# Altium footprint library con-samtec.PCBLIB: 805 footprints (part 32 of 55)
Each footprint in its own frame and in the unit in brackets; x right, y up, seen from the top. Pads: shape width x height; smd on the part's side, far side on the other; paste and mask are expansions set on the pad; w line width, h text height; cw(c..) or ccw(c..) is an arc to the next point about the centre after c.
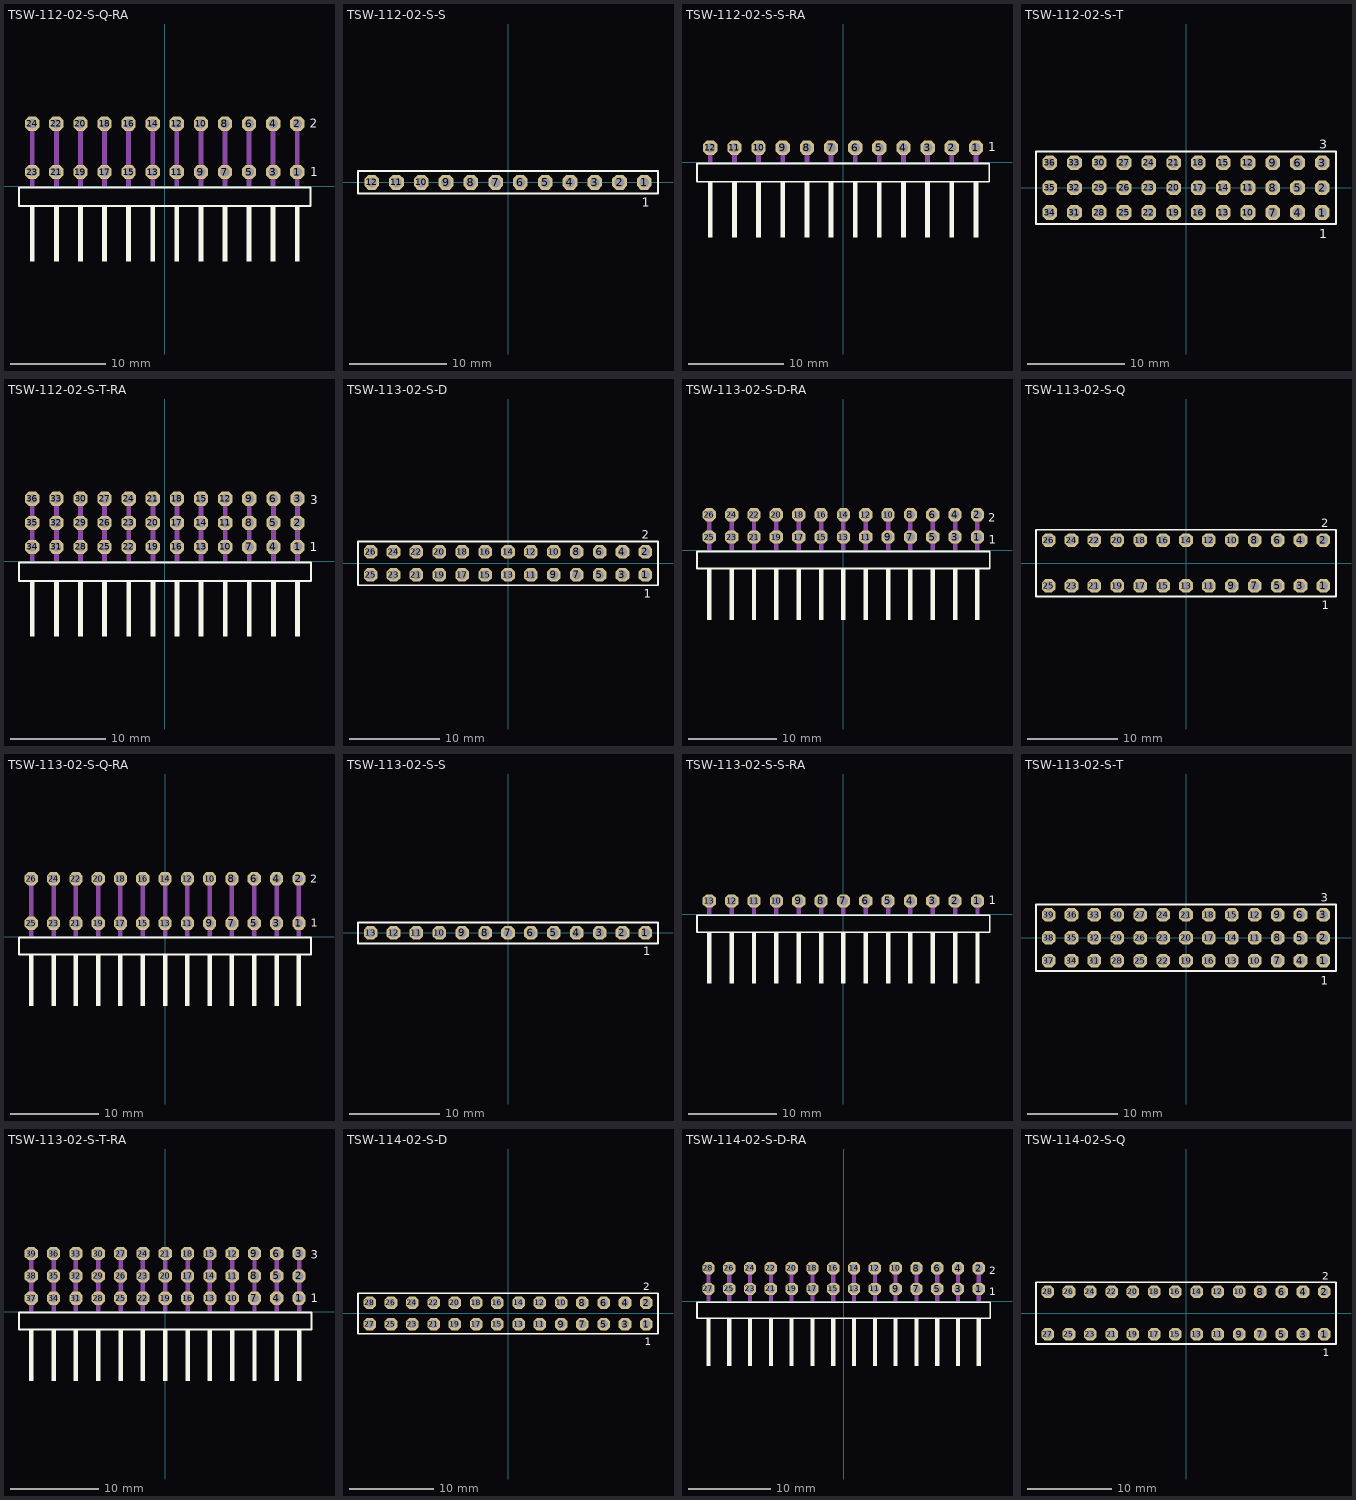
[diagram p31: the footprints below, top view; thin cyan lines are the x and y axes]

## TSW-112-02-S-Q-RA [mil]
pads (24):
  oct 59.06x59.06 hole 39.37: 1(550,60) 2(550,260) 3(450,60) 4(450,260) 5(350,60) 6(350,260) 7(250,60) 8(250,260) 9(150,60) 10(150,260) 11(50,60) 12(50,260) 13(-50,60) 14(-50,260) 15(-150,60) 16(-150,260) 17(-250,60) 18(-250,260) 19(-350,60) 20(-350,260) 21(-450,60) 22(-450,260) 23(-550,60) 24(-550,260)
Top Overlay:
  rectangle: -560,-310.63 -540,-80.32
  rectangle: -460,-310.63 -440,-80.32
  rectangle: -360,-310.63 -340,-80.32
  rectangle: -260,-310.63 -240,-80.32
  rectangle: -160,-310.63 -140,-80.32
  rectangle: -60,-310.63 -40,-80.32
  rectangle: 40,-310.63 60,-80.32
  rectangle: 140,-310.63 160,-80.32
  rectangle: 240,-310.63 260,-80.32
  rectangle: 340,-310.63 360,-80.32
  rectangle: 440,-310.63 460,-80.32
  rectangle: 540,-310.63 560,-80.32
  lines w8: -605.08,-80.55 605.08,-80.55 605.08,-4.17 -605.08,-4.17 -605.08,-80.55
  text "1" at 603.54,43.31 h36.81
  text "2" at 601.18,242.72 h36.81
Mechanical 16:
  rectangle: -560,0 -540,270
  rectangle: -460,0 -440,270
  rectangle: -360,0 -340,270
  rectangle: -260,0 -240,270
  rectangle: -160,0 -140,270
  rectangle: -60,0 -40,270
  rectangle: 40,0 60,270
  rectangle: 140,0 160,270
  rectangle: 240,0 260,270
  rectangle: 340,0 360,270
  rectangle: 440,0 460,270
  rectangle: 540,0 560,270

## TSW-112-02-S-S [mm]
pads (12):
  oct 1.5x1.5 hole 1: 1(13.97,0) 2(11.43,0) 3(8.89,0) 4(6.35,0) 5(3.81,0) 6(1.27,0) 7(-1.27,0) 8(-3.81,0) 9(-6.35,0) 10(-8.89,0) 11(-11.43,0) 12(-13.97,0)
Top Overlay:
  lines w0.203: -15.369,-1.155 15.369,-1.155 15.369,1.155 -15.369,1.155 -15.369,-1.155
  text "1" at 13.712,-2.498 h0.94
Mechanical 16:
  rectangle: -14.32,-0.35 -13.62,0.35
  rectangle: -11.78,-0.35 -11.08,0.35
  rectangle: -9.24,-0.35 -8.54,0.35
  rectangle: -6.7,-0.35 -6,0.35
  rectangle: -4.16,-0.35 -3.46,0.35
  rectangle: -1.62,-0.35 -0.92,0.35
  rectangle: 0.92,-0.35 1.62,0.35
  rectangle: 3.46,-0.35 4.16,0.35
  rectangle: 6,-0.35 6.7,0.35
  rectangle: 8.54,-0.35 9.24,0.35
  rectangle: 11.08,-0.35 11.78,0.35
  rectangle: 13.62,-0.35 14.32,0.35

## TSW-112-02-S-S-RA [mil]
pads (12):
  oct 59.06x59.06 hole 39.37: 1(550,60) 2(450,60) 3(350,60) 4(250,60) 5(150,60) 6(50,60) 7(-50,60) 8(-150,60) 9(-250,60) 10(-350,60) 11(-450,60) 12(-550,60)
Top Overlay:
  rectangle: -560,-310.63 -540,-80.32
  rectangle: -460,-310.63 -440,-80.32
  rectangle: -360,-310.63 -340,-80.32
  rectangle: -260,-310.63 -240,-80.32
  rectangle: -160,-310.63 -140,-80.32
  rectangle: -60,-310.63 -40,-80.32
  rectangle: 40,-310.63 60,-80.32
  rectangle: 140,-310.63 160,-80.32
  rectangle: 240,-310.63 260,-80.32
  rectangle: 340,-310.63 360,-80.32
  rectangle: 440,-310.63 460,-80.32
  rectangle: 540,-310.63 560,-80.32
  lines w8: -605.08,-80.55 605.08,-80.55 605.08,-4.17 -605.08,-4.17 -605.08,-80.55
  text "1" at 600.47,45.35 h36.81
Mechanical 16:
  rectangle: -560,0 -540,70
  rectangle: -460,0 -440,70
  rectangle: -360,0 -340,70
  rectangle: -260,0 -240,70
  rectangle: -160,0 -140,70
  rectangle: -60,0 -40,70
  rectangle: 40,0 60,70
  rectangle: 140,0 160,70
  rectangle: 240,0 260,70
  rectangle: 340,0 360,70
  rectangle: 440,0 460,70
  rectangle: 540,0 560,70

## TSW-112-02-S-T [mm]
pads (36):
  oct 1.5x1.5 hole 1: 1(13.97,-2.54) 2(13.97,0) 3(13.97,2.54) 4(11.43,-2.54) 5(11.43,0) 6(11.43,2.54) 7(8.89,-2.54) 8(8.89,0) 9(8.89,2.54) 10(6.35,-2.54) 11(6.35,0) 12(6.35,2.54) 13(3.81,-2.54) 14(3.81,0) 15(3.81,2.54) 16(1.27,-2.54) 17(1.27,0) 18(1.27,2.54) 19(-1.27,-2.54) 20(-1.27,0) 21(-1.27,2.54) 22(-3.81,-2.54) 23(-3.81,0) 24(-3.81,2.54) 25(-6.35,-2.54) 26(-6.35,0) 27(-6.35,2.54) 28(-8.89,-2.54) 29(-8.89,0) 30(-8.89,2.54) 31(-11.43,-2.54) 32(-11.43,0) 33(-11.43,2.54) 34(-13.97,-2.54) 35(-13.97,0) 36(-13.97,2.54)
Top Overlay:
  lines w0.203: -15.369,-3.695 15.369,-3.695 15.369,3.695 -15.369,3.695 -15.369,-3.695
  text "1" at 13.662,-5.188 h0.94
  text "3" at 13.658,3.989 h0.94
Mechanical 16:
  rectangle: -14.32,-2.89 -13.62,-2.19
  rectangle: -14.32,-0.35 -13.62,0.35
  rectangle: -14.32,2.19 -13.62,2.89
  rectangle: -11.78,-2.89 -11.08,-2.19
  rectangle: -11.78,-0.35 -11.08,0.35
  rectangle: -11.78,2.19 -11.08,2.89
  rectangle: -9.24,-2.89 -8.54,-2.19
  rectangle: -9.24,-0.35 -8.54,0.35
  rectangle: -9.24,2.19 -8.54,2.89
  rectangle: -6.7,-2.89 -6,-2.19
  rectangle: -6.7,-0.35 -6,0.35
  rectangle: -6.7,2.19 -6,2.89
  rectangle: -4.16,-2.89 -3.46,-2.19
  rectangle: -4.16,-0.35 -3.46,0.35
  rectangle: -4.16,2.19 -3.46,2.89
  rectangle: -1.62,-2.89 -0.92,-2.19
  rectangle: -1.62,-0.35 -0.92,0.35
  rectangle: -1.62,2.19 -0.92,2.89
  rectangle: 0.92,-2.89 1.62,-2.19
  rectangle: 0.92,-0.35 1.62,0.35
  rectangle: 0.92,2.19 1.62,2.89
  rectangle: 3.46,-2.89 4.16,-2.19
  rectangle: 3.46,-0.35 4.16,0.35
  rectangle: 3.46,2.19 4.16,2.89
  rectangle: 6,-2.89 6.7,-2.19
  rectangle: 6,-0.35 6.7,0.35
  rectangle: 6,2.19 6.7,2.89
  rectangle: 8.54,-2.89 9.24,-2.19
  rectangle: 8.54,-0.35 9.24,0.35
  rectangle: 8.54,2.19 9.24,2.89
  rectangle: 11.08,-2.89 11.78,-2.19
  rectangle: 11.08,-0.35 11.78,0.35
  rectangle: 11.08,2.19 11.78,2.89
  rectangle: 13.62,-2.89 14.32,-2.19
  rectangle: 13.62,-0.35 14.32,0.35
  rectangle: 13.62,2.19 14.32,2.89

## TSW-112-02-S-T-RA [mil]
pads (36):
  oct 59.06x59.06 hole 39.37: 1(550,60) 2(550,160) 3(550,260) 4(450,60) 5(450,160) 6(450,260) 7(350,60) 8(350,160) 9(350,260) 10(250,60) 11(250,160) 12(250,260) 13(150,60) 14(150,160) 15(150,260) 16(50,60) 17(50,160) 18(50,260) 19(-50,60) 20(-50,160) 21(-50,260) 22(-150,60) 23(-150,160) 24(-150,260) 25(-250,60) 26(-250,160) 27(-250,260) 28(-350,60) 29(-350,160) 30(-350,260) 31(-450,60) 32(-450,160) 33(-450,260) 34(-550,60) 35(-550,160) 36(-550,260)
Top Overlay:
  rectangle: -560,-310.63 -540,-80.32
  rectangle: -460,-310.63 -440,-80.32
  rectangle: -360,-310.63 -340,-80.32
  rectangle: -260,-310.63 -240,-80.32
  rectangle: -160,-310.63 -140,-80.32
  rectangle: -60,-310.63 -40,-80.32
  rectangle: 40,-310.63 60,-80.32
  rectangle: 140,-310.63 160,-80.32
  rectangle: 240,-310.63 260,-80.32
  rectangle: 340,-310.63 360,-80.32
  rectangle: 440,-310.63 460,-80.32
  rectangle: 540,-310.63 560,-80.32
  lines w8: -605.08,-80.55 605.08,-80.55 605.08,-4.17 -605.08,-4.17 -605.08,-80.55
  text "1" at 601.57,41.34 h36.81
  text "3" at 602.17,236.81 h36.81
Mechanical 16:
  rectangle: -560,0 -540,270
  rectangle: -460,0 -440,270
  rectangle: -360,0 -340,270
  rectangle: -260,0 -240,270
  rectangle: -160,0 -140,270
  rectangle: -60,0 -40,270
  rectangle: 40,0 60,270
  rectangle: 140,0 160,270
  rectangle: 240,0 260,270
  rectangle: 340,0 360,270
  rectangle: 440,0 460,270
  rectangle: 540,0 560,270

## TSW-113-02-S-D [mm]
pads (26):
  oct 1.5x1.5 hole 1: 1(15.24,-1.27) 2(15.24,1.27) 3(12.7,-1.27) 4(12.7,1.27) 5(10.16,-1.27) 6(10.16,1.27) 7(7.62,-1.27) 8(7.62,1.27) 9(5.08,-1.27) 10(5.08,1.27) 11(2.54,-1.27) 12(2.54,1.27) 13(0,-1.27) 14(0,1.27) 15(-2.54,-1.27) 16(-2.54,1.27) 17(-5.08,-1.27) 18(-5.08,1.27) 19(-7.62,-1.27) 20(-7.62,1.27) 21(-10.16,-1.27) 22(-10.16,1.27) 23(-12.7,-1.27) 24(-12.7,1.27) 25(-15.24,-1.27) 26(-15.24,1.27)
Top Overlay:
  lines w0.203: -16.639,-2.425 16.639,-2.425 16.639,2.425 -16.639,2.425 -16.639,-2.425
  text "1" at 15.032,-3.818 h0.94
  text "2" at 14.857,2.744 h0.94
Mechanical 16:
  rectangle: -15.59,-1.62 -14.89,-0.92
  rectangle: -15.59,0.92 -14.89,1.62
  rectangle: -13.05,-1.62 -12.35,-0.92
  rectangle: -13.05,0.92 -12.35,1.62
  rectangle: -10.51,-1.62 -9.81,-0.92
  rectangle: -10.51,0.92 -9.81,1.62
  rectangle: -7.97,-1.62 -7.27,-0.92
  rectangle: -7.97,0.92 -7.27,1.62
  rectangle: -5.43,-1.62 -4.73,-0.92
  rectangle: -5.43,0.92 -4.73,1.62
  rectangle: -2.89,-1.62 -2.19,-0.92
  rectangle: -2.89,0.92 -2.19,1.62
  rectangle: -0.35,-1.62 0.35,-0.92
  rectangle: -0.35,0.92 0.35,1.62
  rectangle: 2.19,-1.62 2.89,-0.92
  rectangle: 2.19,0.92 2.89,1.62
  rectangle: 4.73,-1.62 5.43,-0.92
  rectangle: 4.73,0.92 5.43,1.62
  rectangle: 7.27,-1.62 7.97,-0.92
  rectangle: 7.27,0.92 7.97,1.62
  rectangle: 9.81,-1.62 10.51,-0.92
  rectangle: 9.81,0.92 10.51,1.62
  rectangle: 12.35,-1.62 13.05,-0.92
  rectangle: 12.35,0.92 13.05,1.62
  rectangle: 14.89,-1.62 15.59,-0.92
  rectangle: 14.89,0.92 15.59,1.62

## TSW-113-02-S-D-RA [mil]
pads (26):
  oct 59.06x59.06 hole 39.37: 1(600,60) 2(600,160) 3(500,60) 4(500,160) 5(400,60) 6(400,160) 7(300,60) 8(300,160) 9(200,60) 10(200,160) 11(100,60) 12(100,160) 13(0,60) 14(0,160) 15(-100,60) 16(-100,160) 17(-200,60) 18(-200,160) 19(-300,60) 20(-300,160) 21(-400,60) 22(-400,160) 23(-500,60) 24(-500,160) 25(-600,60) 26(-600,160)
Top Overlay:
  rectangle: -610,-310.63 -590,-80.32
  rectangle: -510,-310.63 -490,-80.32
  rectangle: -410,-310.63 -390,-80.32
  rectangle: -310,-310.63 -290,-80.32
  rectangle: -210,-310.63 -190,-80.32
  rectangle: -110,-310.63 -90,-80.32
  rectangle: -10,-310.63 10,-80.32
  rectangle: 90,-310.63 110,-80.32
  rectangle: 190,-310.63 210,-80.32
  rectangle: 290,-310.63 310,-80.32
  rectangle: 390,-310.63 410,-80.32
  rectangle: 490,-310.63 510,-80.32
  rectangle: 590,-310.63 610,-80.32
  lines w8: -655.08,-80.55 655.08,-80.55 655.08,-4.17 -655.08,-4.17 -655.08,-80.55
  text "1" at 650.59,30.51 h36.81
  text "2" at 649.21,129.53 h36.81
Mechanical 16:
  rectangle: -610,0 -590,170
  rectangle: -510,0 -490,170
  rectangle: -410,0 -390,170
  rectangle: -310,0 -290,170
  rectangle: -210,0 -190,170
  rectangle: -110,0 -90,170
  rectangle: -10,0 10,170
  rectangle: 90,0 110,170
  rectangle: 190,0 210,170
  rectangle: 290,0 310,170
  rectangle: 390,0 410,170
  rectangle: 490,0 510,170
  rectangle: 590,0 610,170

## TSW-113-02-S-Q [mm]
pads (26):
  oct 1.5x1.5 hole 1: 1(15.24,-2.54) 2(15.24,2.54) 3(12.7,-2.54) 4(12.7,2.54) 5(10.16,-2.54) 6(10.16,2.54) 7(7.62,-2.54) 8(7.62,2.54) 9(5.08,-2.54) 10(5.08,2.54) 11(2.54,-2.54) 12(2.54,2.54) 13(0,-2.54) 14(0,2.54) 15(-2.54,-2.54) 16(-2.54,2.54) 17(-5.08,-2.54) 18(-5.08,2.54) 19(-7.62,-2.54) 20(-7.62,2.54) 21(-10.16,-2.54) 22(-10.16,2.54) 23(-12.7,-2.54) 24(-12.7,2.54) 25(-15.24,-2.54) 26(-15.24,2.54)
Top Overlay:
  lines w0.203: -16.639,-3.695 16.639,-3.695 16.639,3.695 -16.639,3.695 -16.639,-3.695
  text "1" at 15.082,-5.138 h0.94
  text "2" at 14.982,3.989 h0.94
Mechanical 16:
  rectangle: -15.59,-2.89 -14.89,-2.19
  rectangle: -15.59,2.19 -14.89,2.89
  rectangle: -13.05,-2.89 -12.35,-2.19
  rectangle: -13.05,2.19 -12.35,2.89
  rectangle: -10.51,-2.89 -9.81,-2.19
  rectangle: -10.51,2.19 -9.81,2.89
  rectangle: -7.97,-2.89 -7.27,-2.19
  rectangle: -7.97,2.19 -7.27,2.89
  rectangle: -5.43,-2.89 -4.73,-2.19
  rectangle: -5.43,2.19 -4.73,2.89
  rectangle: -2.89,-2.89 -2.19,-2.19
  rectangle: -2.89,2.19 -2.19,2.89
  rectangle: -0.35,-2.89 0.35,-2.19
  rectangle: -0.35,2.19 0.35,2.89
  rectangle: 2.19,-2.89 2.89,-2.19
  rectangle: 2.19,2.19 2.89,2.89
  rectangle: 4.73,-2.89 5.43,-2.19
  rectangle: 4.73,2.19 5.43,2.89
  rectangle: 7.27,-2.89 7.97,-2.19
  rectangle: 7.27,2.19 7.97,2.89
  rectangle: 9.81,-2.89 10.51,-2.19
  rectangle: 9.81,2.19 10.51,2.89
  rectangle: 12.35,-2.89 13.05,-2.19
  rectangle: 12.35,2.19 13.05,2.89
  rectangle: 14.89,-2.89 15.59,-2.19
  rectangle: 14.89,2.19 15.59,2.89

## TSW-113-02-S-Q-RA [mil]
pads (26):
  oct 59.06x59.06 hole 39.37: 1(600,60) 2(600,260) 3(500,60) 4(500,260) 5(400,60) 6(400,260) 7(300,60) 8(300,260) 9(200,60) 10(200,260) 11(100,60) 12(100,260) 13(0,60) 14(0,260) 15(-100,60) 16(-100,260) 17(-200,60) 18(-200,260) 19(-300,60) 20(-300,260) 21(-400,60) 22(-400,260) 23(-500,60) 24(-500,260) 25(-600,60) 26(-600,260)
Top Overlay:
  rectangle: -610,-310.63 -590,-80.32
  rectangle: -510,-310.63 -490,-80.32
  rectangle: -410,-310.63 -390,-80.32
  rectangle: -310,-310.63 -290,-80.32
  rectangle: -210,-310.63 -190,-80.32
  rectangle: -110,-310.63 -90,-80.32
  rectangle: -10,-310.63 10,-80.32
  rectangle: 90,-310.63 110,-80.32
  rectangle: 190,-310.63 210,-80.32
  rectangle: 290,-310.63 310,-80.32
  rectangle: 390,-310.63 410,-80.32
  rectangle: 490,-310.63 510,-80.32
  rectangle: 590,-310.63 610,-80.32
  lines w8: -655.08,-80.55 655.08,-80.55 655.08,-4.17 -655.08,-4.17 -655.08,-80.55
  text "1" at 653.54,43.31 h36.81
  text "2" at 651.18,242.72 h36.81
Mechanical 16:
  rectangle: -610,0 -590,270
  rectangle: -510,0 -490,270
  rectangle: -410,0 -390,270
  rectangle: -310,0 -290,270
  rectangle: -210,0 -190,270
  rectangle: -110,0 -90,270
  rectangle: -10,0 10,270
  rectangle: 90,0 110,270
  rectangle: 190,0 210,270
  rectangle: 290,0 310,270
  rectangle: 390,0 410,270
  rectangle: 490,0 510,270
  rectangle: 590,0 610,270

## TSW-113-02-S-S [mm]
pads (13):
  oct 1.5x1.5 hole 1: 1(15.24,0) 2(12.7,0) 3(10.16,0) 4(7.62,0) 5(5.08,0) 6(2.54,0) 7(0,0) 8(-2.54,0) 9(-5.08,0) 10(-7.62,0) 11(-10.16,0) 12(-12.7,0) 13(-15.24,0)
Top Overlay:
  lines w0.203: -16.639,-1.155 16.639,-1.155 16.639,1.155 -16.639,1.155 -16.639,-1.155
  text "1" at 14.982,-2.498 h0.94
Mechanical 16:
  rectangle: -15.59,-0.35 -14.89,0.35
  rectangle: -13.05,-0.35 -12.35,0.35
  rectangle: -10.51,-0.35 -9.81,0.35
  rectangle: -7.97,-0.35 -7.27,0.35
  rectangle: -5.43,-0.35 -4.73,0.35
  rectangle: -2.89,-0.35 -2.19,0.35
  rectangle: -0.35,-0.35 0.35,0.35
  rectangle: 2.19,-0.35 2.89,0.35
  rectangle: 4.73,-0.35 5.43,0.35
  rectangle: 7.27,-0.35 7.97,0.35
  rectangle: 9.81,-0.35 10.51,0.35
  rectangle: 12.35,-0.35 13.05,0.35
  rectangle: 14.89,-0.35 15.59,0.35

## TSW-113-02-S-S-RA [mil]
pads (13):
  oct 59.06x59.06 hole 39.37: 1(600,60) 2(500,60) 3(400,60) 4(300,60) 5(200,60) 6(100,60) 7(0,60) 8(-100,60) 9(-200,60) 10(-300,60) 11(-400,60) 12(-500,60) 13(-600,60)
Top Overlay:
  rectangle: -610,-310.63 -590,-80.32
  rectangle: -510,-310.63 -490,-80.32
  rectangle: -410,-310.63 -390,-80.32
  rectangle: -310,-310.63 -290,-80.32
  rectangle: -210,-310.63 -190,-80.32
  rectangle: -110,-310.63 -90,-80.32
  rectangle: -10,-310.63 10,-80.32
  rectangle: 90,-310.63 110,-80.32
  rectangle: 190,-310.63 210,-80.32
  rectangle: 290,-310.63 310,-80.32
  rectangle: 390,-310.63 410,-80.32
  rectangle: 490,-310.63 510,-80.32
  rectangle: 590,-310.63 610,-80.32
  lines w8: -655.08,-80.55 655.08,-80.55 655.08,-4.17 -655.08,-4.17 -655.08,-80.55
  text "1" at 650.47,45.35 h36.81
Mechanical 16:
  rectangle: -610,0 -590,70
  rectangle: -510,0 -490,70
  rectangle: -410,0 -390,70
  rectangle: -310,0 -290,70
  rectangle: -210,0 -190,70
  rectangle: -110,0 -90,70
  rectangle: -10,0 10,70
  rectangle: 90,0 110,70
  rectangle: 190,0 210,70
  rectangle: 290,0 310,70
  rectangle: 390,0 410,70
  rectangle: 490,0 510,70
  rectangle: 590,0 610,70

## TSW-113-02-S-T [mm]
pads (39):
  oct 1.5x1.5 hole 1: 1(15.24,-2.54) 2(15.24,0) 3(15.24,2.54) 4(12.7,-2.54) 5(12.7,0) 6(12.7,2.54) 7(10.16,-2.54) 8(10.16,0) 9(10.16,2.54) 10(7.62,-2.54) 11(7.62,0) 12(7.62,2.54) 13(5.08,-2.54) 14(5.08,0) 15(5.08,2.54) 16(2.54,-2.54) 17(2.54,0) 18(2.54,2.54) 19(0,-2.54) 20(0,0) 21(0,2.54) 22(-2.54,-2.54) 23(-2.54,0) 24(-2.54,2.54) 25(-5.08,-2.54) 26(-5.08,0) 27(-5.08,2.54) 28(-7.62,-2.54) 29(-7.62,0) 30(-7.62,2.54) 31(-10.16,-2.54) 32(-10.16,0) 33(-10.16,2.54) 34(-12.7,-2.54) 35(-12.7,0) 36(-12.7,2.54) 37(-15.24,-2.54) 38(-15.24,0) 39(-15.24,2.54)
Top Overlay:
  lines w0.203: -16.639,-3.695 16.639,-3.695 16.639,3.695 -16.639,3.695 -16.639,-3.695
  text "1" at 14.932,-5.188 h0.94
  text "3" at 14.928,3.989 h0.94
Mechanical 16:
  rectangle: -15.59,-2.89 -14.89,-2.19
  rectangle: -15.59,-0.35 -14.89,0.35
  rectangle: -15.59,2.19 -14.89,2.89
  rectangle: -13.05,-2.89 -12.35,-2.19
  rectangle: -13.05,-0.35 -12.35,0.35
  rectangle: -13.05,2.19 -12.35,2.89
  rectangle: -10.51,-2.89 -9.81,-2.19
  rectangle: -10.51,-0.35 -9.81,0.35
  rectangle: -10.51,2.19 -9.81,2.89
  rectangle: -7.97,-2.89 -7.27,-2.19
  rectangle: -7.97,-0.35 -7.27,0.35
  rectangle: -7.97,2.19 -7.27,2.89
  rectangle: -5.43,-2.89 -4.73,-2.19
  rectangle: -5.43,-0.35 -4.73,0.35
  rectangle: -5.43,2.19 -4.73,2.89
  rectangle: -2.89,-2.89 -2.19,-2.19
  rectangle: -2.89,-0.35 -2.19,0.35
  rectangle: -2.89,2.19 -2.19,2.89
  rectangle: -0.35,-2.89 0.35,-2.19
  rectangle: -0.35,-0.35 0.35,0.35
  rectangle: -0.35,2.19 0.35,2.89
  rectangle: 2.19,-2.89 2.89,-2.19
  rectangle: 2.19,-0.35 2.89,0.35
  rectangle: 2.19,2.19 2.89,2.89
  rectangle: 4.73,-2.89 5.43,-2.19
  rectangle: 4.73,-0.35 5.43,0.35
  rectangle: 4.73,2.19 5.43,2.89
  rectangle: 7.27,-2.89 7.97,-2.19
  rectangle: 7.27,-0.35 7.97,0.35
  rectangle: 7.27,2.19 7.97,2.89
  rectangle: 9.81,-2.89 10.51,-2.19
  rectangle: 9.81,-0.35 10.51,0.35
  rectangle: 9.81,2.19 10.51,2.89
  rectangle: 12.35,-2.89 13.05,-2.19
  rectangle: 12.35,-0.35 13.05,0.35
  rectangle: 12.35,2.19 13.05,2.89
  rectangle: 14.89,-2.89 15.59,-2.19
  rectangle: 14.89,-0.35 15.59,0.35
  rectangle: 14.89,2.19 15.59,2.89

## TSW-113-02-S-T-RA [mil]
pads (39):
  oct 59.06x59.06 hole 39.37: 1(600,60) 2(600,160) 3(600,260) 4(500,60) 5(500,160) 6(500,260) 7(400,60) 8(400,160) 9(400,260) 10(300,60) 11(300,160) 12(300,260) 13(200,60) 14(200,160) 15(200,260) 16(100,60) 17(100,160) 18(100,260) 19(0,60) 20(0,160) 21(0,260) 22(-100,60) 23(-100,160) 24(-100,260) 25(-200,60) 26(-200,160) 27(-200,260) 28(-300,60) 29(-300,160) 30(-300,260) 31(-400,60) 32(-400,160) 33(-400,260) 34(-500,60) 35(-500,160) 36(-500,260) 37(-600,60) 38(-600,160) 39(-600,260)
Top Overlay:
  rectangle: -610,-310.63 -590,-80.32
  rectangle: -510,-310.63 -490,-80.32
  rectangle: -410,-310.63 -390,-80.32
  rectangle: -310,-310.63 -290,-80.32
  rectangle: -210,-310.63 -190,-80.32
  rectangle: -110,-310.63 -90,-80.32
  rectangle: -10,-310.63 10,-80.32
  rectangle: 90,-310.63 110,-80.32
  rectangle: 190,-310.63 210,-80.32
  rectangle: 290,-310.63 310,-80.32
  rectangle: 390,-310.63 410,-80.32
  rectangle: 490,-310.63 510,-80.32
  rectangle: 590,-310.63 610,-80.32
  lines w8: -655.08,-80.55 655.08,-80.55 655.08,-4.17 -655.08,-4.17 -655.08,-80.55
  text "1" at 651.57,41.34 h36.81
  text "3" at 652.17,236.81 h36.81
Mechanical 16:
  rectangle: -610,0 -590,270
  rectangle: -510,0 -490,270
  rectangle: -410,0 -390,270
  rectangle: -310,0 -290,270
  rectangle: -210,0 -190,270
  rectangle: -110,0 -90,270
  rectangle: -10,0 10,270
  rectangle: 90,0 110,270
  rectangle: 190,0 210,270
  rectangle: 290,0 310,270
  rectangle: 390,0 410,270
  rectangle: 490,0 510,270
  rectangle: 590,0 610,270

## TSW-114-02-S-D [mm]
pads (28):
  oct 1.5x1.5 hole 1: 1(16.51,-1.27) 2(16.51,1.27) 3(13.97,-1.27) 4(13.97,1.27) 5(11.43,-1.27) 6(11.43,1.27) 7(8.89,-1.27) 8(8.89,1.27) 9(6.35,-1.27) 10(6.35,1.27) 11(3.81,-1.27) 12(3.81,1.27) 13(1.27,-1.27) 14(1.27,1.27) 15(-1.27,-1.27) 16(-1.27,1.27) 17(-3.81,-1.27) 18(-3.81,1.27) 19(-6.35,-1.27) 20(-6.35,1.27) 21(-8.89,-1.27) 22(-8.89,1.27) 23(-11.43,-1.27) 24(-11.43,1.27) 25(-13.97,-1.27) 26(-13.97,1.27) 27(-16.51,-1.27) 28(-16.51,1.27)
Top Overlay:
  lines w0.203: -17.909,-2.425 17.909,-2.425 17.909,2.425 -17.909,2.425 -17.909,-2.425
  text "1" at 16.302,-3.818 h0.94
  text "2" at 16.127,2.744 h0.94
Mechanical 16:
  rectangle: -16.86,-1.62 -16.16,-0.92
  rectangle: -16.86,0.92 -16.16,1.62
  rectangle: -14.32,-1.62 -13.62,-0.92
  rectangle: -14.32,0.92 -13.62,1.62
  rectangle: -11.78,-1.62 -11.08,-0.92
  rectangle: -11.78,0.92 -11.08,1.62
  rectangle: -9.24,-1.62 -8.54,-0.92
  rectangle: -9.24,0.92 -8.54,1.62
  rectangle: -6.7,-1.62 -6,-0.92
  rectangle: -6.7,0.92 -6,1.62
  rectangle: -4.16,-1.62 -3.46,-0.92
  rectangle: -4.16,0.92 -3.46,1.62
  rectangle: -1.62,-1.62 -0.92,-0.92
  rectangle: -1.62,0.92 -0.92,1.62
  rectangle: 0.92,-1.62 1.62,-0.92
  rectangle: 0.92,0.92 1.62,1.62
  rectangle: 3.46,-1.62 4.16,-0.92
  rectangle: 3.46,0.92 4.16,1.62
  rectangle: 6,-1.62 6.7,-0.92
  rectangle: 6,0.92 6.7,1.62
  rectangle: 8.54,-1.62 9.24,-0.92
  rectangle: 8.54,0.92 9.24,1.62
  rectangle: 11.08,-1.62 11.78,-0.92
  rectangle: 11.08,0.92 11.78,1.62
  rectangle: 13.62,-1.62 14.32,-0.92
  rectangle: 13.62,0.92 14.32,1.62
  rectangle: 16.16,-1.62 16.86,-0.92
  rectangle: 16.16,0.92 16.86,1.62

## TSW-114-02-S-D-RA [mil]
pads (28):
  oct 59.06x59.06 hole 39.37: 1(650,60) 2(650,160) 3(550,60) 4(550,160) 5(450,60) 6(450,160) 7(350,60) 8(350,160) 9(250,60) 10(250,160) 11(150,60) 12(150,160) 13(50,60) 14(50,160) 15(-50,60) 16(-50,160) 17(-150,60) 18(-150,160) 19(-250,60) 20(-250,160) 21(-350,60) 22(-350,160) 23(-450,60) 24(-450,160) 25(-550,60) 26(-550,160) 27(-650,60) 28(-650,160)
Top Overlay:
  rectangle: -660,-310.63 -640,-80.32
  rectangle: -560,-310.63 -540,-80.32
  rectangle: -460,-310.63 -440,-80.32
  rectangle: -360,-310.63 -340,-80.32
  rectangle: -260,-310.63 -240,-80.32
  rectangle: -160,-310.63 -140,-80.32
  rectangle: -60,-310.63 -40,-80.32
  rectangle: 40,-310.63 60,-80.32
  rectangle: 140,-310.63 160,-80.32
  rectangle: 240,-310.63 260,-80.32
  rectangle: 340,-310.63 360,-80.32
  rectangle: 440,-310.63 460,-80.32
  rectangle: 540,-310.63 560,-80.32
  rectangle: 640,-310.63 660,-80.32
  lines w8: -705.08,-80.55 705.08,-80.55 705.08,-4.17 -705.08,-4.17 -705.08,-80.55
  text "1" at 700.59,30.51 h36.81
  text "2" at 699.21,129.53 h36.81
Mechanical 16:
  rectangle: -660,0 -640,170
  rectangle: -560,0 -540,170
  rectangle: -460,0 -440,170
  rectangle: -360,0 -340,170
  rectangle: -260,0 -240,170
  rectangle: -160,0 -140,170
  rectangle: -60,0 -40,170
  rectangle: 40,0 60,170
  rectangle: 140,0 160,170
  rectangle: 240,0 260,170
  rectangle: 340,0 360,170
  rectangle: 440,0 460,170
  rectangle: 540,0 560,170
  rectangle: 640,0 660,170

## TSW-114-02-S-Q [mm]
pads (28):
  oct 1.5x1.5 hole 1: 1(16.51,-2.54) 2(16.51,2.54) 3(13.97,-2.54) 4(13.97,2.54) 5(11.43,-2.54) 6(11.43,2.54) 7(8.89,-2.54) 8(8.89,2.54) 9(6.35,-2.54) 10(6.35,2.54) 11(3.81,-2.54) 12(3.81,2.54) 13(1.27,-2.54) 14(1.27,2.54) 15(-1.27,-2.54) 16(-1.27,2.54) 17(-3.81,-2.54) 18(-3.81,2.54) 19(-6.35,-2.54) 20(-6.35,2.54) 21(-8.89,-2.54) 22(-8.89,2.54) 23(-11.43,-2.54) 24(-11.43,2.54) 25(-13.97,-2.54) 26(-13.97,2.54) 27(-16.51,-2.54) 28(-16.51,2.54)
Top Overlay:
  lines w0.203: -17.909,-3.695 17.909,-3.695 17.909,3.695 -17.909,3.695 -17.909,-3.695
  text "1" at 16.352,-5.138 h0.94
  text "2" at 16.252,3.989 h0.94
Mechanical 16:
  rectangle: -16.86,-2.89 -16.16,-2.19
  rectangle: -16.86,2.19 -16.16,2.89
  rectangle: -14.32,-2.89 -13.62,-2.19
  rectangle: -14.32,2.19 -13.62,2.89
  rectangle: -11.78,-2.89 -11.08,-2.19
  rectangle: -11.78,2.19 -11.08,2.89
  rectangle: -9.24,-2.89 -8.54,-2.19
  rectangle: -9.24,2.19 -8.54,2.89
  rectangle: -6.7,-2.89 -6,-2.19
  rectangle: -6.7,2.19 -6,2.89
  rectangle: -4.16,-2.89 -3.46,-2.19
  rectangle: -4.16,2.19 -3.46,2.89
  rectangle: -1.62,-2.89 -0.92,-2.19
  rectangle: -1.62,2.19 -0.92,2.89
  rectangle: 0.92,-2.89 1.62,-2.19
  rectangle: 0.92,2.19 1.62,2.89
  rectangle: 3.46,-2.89 4.16,-2.19
  rectangle: 3.46,2.19 4.16,2.89
  rectangle: 6,-2.89 6.7,-2.19
  rectangle: 6,2.19 6.7,2.89
  rectangle: 8.54,-2.89 9.24,-2.19
  rectangle: 8.54,2.19 9.24,2.89
  rectangle: 11.08,-2.89 11.78,-2.19
  rectangle: 11.08,2.19 11.78,2.89
  rectangle: 13.62,-2.89 14.32,-2.19
  rectangle: 13.62,2.19 14.32,2.89
  rectangle: 16.16,-2.89 16.86,-2.19
  rectangle: 16.16,2.19 16.86,2.89